# Altium integrated library PAT Connectors Board.IntLib: 28 symbols
Pins are listed as number, name and electrical type; pins without a type are passive.

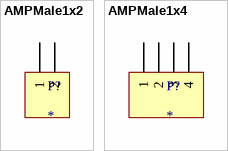
[diagram p0: symbols AMPMale1x2 to AMPMale1x4]

## AMPMale1x2
designator P?
Connector Polarized AMP 2.54mm; Digi-key Part Number: A19423-ND
footprint AMPMALE1x2
pins: 1, 2

## AMPMale1x4
designator P?
Connector Polarized AMP 2.54mm; Digi-key Part Number: A19431-ND
footprint AMPMale1x4
pins: 1, 2, 3, 4


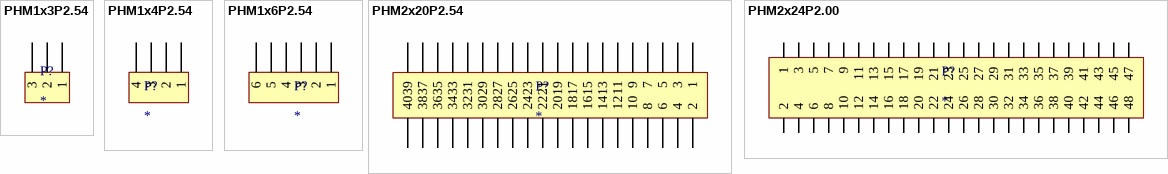
[diagram p1: symbols PHM1x3P2.54 to PHM2x24P2.00]

## PHM1x3P2.54
designator P?
Pin Header Male 3 Pins Pitch 2.54mm; Digi-Key Part Number: WM8085-ND
footprint MALE3PIN (Pin Header Male 3 Pins)
pins: 1, 2, 3

## PHM1x4P2.54
designator P?
Pin Header Male 1x4 Pitch 2.54mm; Digi-Key Part Number: 3M9449-ND
footprint MALE4PIN (Pin Header Male 1x4 Pitch 2.54mm)
pins: 1, 2, 3, 4

## PHM1x6P2.54
designator P?
Pin Header Male 6 Pins Pitch 2.54mm; Digi-Key Part Number: *
footprint MALE6PIN
pins: 1, 2, 3, 4, 5, 6

## PHM2x20P2.54
designator P?
Pin Header Male 40 Pins Pitch 2.54mm; Digi-Key Part Number: *
footprint MALE2x20PIN (Pin Header Male 40 Pins 2Rows)
pins: 1, 2, 3, 4, 5, 6, 7, 8, 9, 10, 11, 12, 13, 14, 15, 16, 17, 18, 19, 20, 21, 22, 23, 24, 25, 26, 27, 28, 29, 30, 31, 32, 33, 34, 35, 36, 37, 38, 39, 40

## PHM2x24P2.00
designator P?
Pin Header Male 2x24 pins with pitch 2mm; Digi-Key Part Number: 609-2908-ND
footprint MALEPIN2x24P2.0
footprint MALEPIN2x24P2.0RightAngle
pins: 1, 2, 3, 4, 5, 6, 7, 8, 9, 10, 11, 12, 13, 14, 15, 16, 17, 18, 19, 20, 21, 22, 23, 24, 25, 26, 27, 28, 29, 30, 31, 32, 33, 34, 35, 36, 37, 38, 39, 40, 41, 42, 43, 44, 45, 46, 47, 48


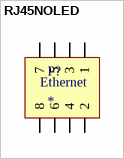
[diagram p2: symbol RJ45NOLED]

## RJ45NOLED
designator P?
Connector RJ45 Ethernet; Digi-Key Part Number: AE10387-ND
footprint RJ45NOLED (Connector RJ45 without led status)
pins: 1, 2, 3, 4, 5, 6, 7, 8
text: Ethernet


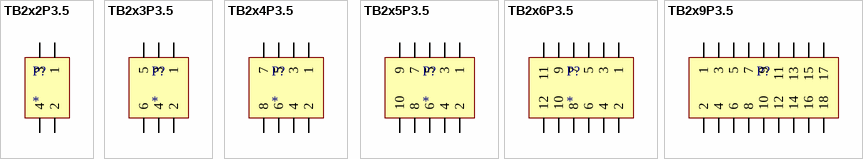
[diagram p3: symbols TB2x2P3.5 to TB2x9P3.5]

## TB2x2P3.5
designator P?
Connector Pitch 3.5mm with 2 rows and 2 columns; Digi-Key Part Number: 277-8738-ND
footprint TB2x2P3.5 (Terminal Block 2x3 with pitch 3.5mm)
pins: 1, 2, 3, 4

## TB2x3P3.5
designator P?
Connector Pitch 3.5mm with 2 rows and 3 columns; Digi-Key Part Number: 277-9777-ND
footprint TB2x3P3.5 (Terminal Block 2x3 with pitch 3.5mm)
pins: 1, 2, 3, 4, 5, 6

## TB2x4P3.5
designator P?
Connector Pitch 3.5mm with 2 rows and 4 columns; Digi-Key Part Number: 277-8739-ND
footprint TB2x4P3.5 (Terminal Block 2x4 with pitch 3.5mm)
pins: 1, 2, 3, 4, 5, 6, 7, 8

## TB2x5P3.5
designator P?
Connector Pitch 3.5mm with 2 rows and 5 columns; Digi-Key Part Number: 277-8740-ND
footprint TB2x5P3.5 (Terminal Block 2x5 with pitch 3.5mm)
pins: 1, 2, 3, 4, 5, 6, 7, 8, 9, 10

## TB2x6P3.5
designator P?
Connector Pitch 3.5mm with 2 rows and 6 columns; Digi-Key Part Number: 277-8741-ND
footprint TB2x6P3.5 (Terminal Block 2x6 with pitch 3.5mm)
pins: 1, 2, 3, 4, 5, 6, 7, 8, 9, 10, 11, 12

## TB2x9P3.5
designator P?  (value not drawn)
Connector Pitch 3.5mm with 2 rows and 9 columns
footprint TB2x9P3.5 (Terminal Block 2x11 with pitch 3.5mm)
pins: 1, 2, 3, 4, 5, 6, 7, 8, 9, 10, 11, 12, 13, 14, 15, 16, 17, 18


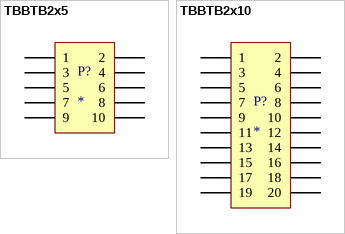
[diagram p4: symbols TBBTB2x5 to TBBTB2x10]

## TBBTB2x5
designator P?
Connector board to board 2 Rows, 5 Columns Pitch 2.54mm; Digi-Key Part Number: ED1543-ND
footprint TBBTB2x5 (Board to Board 2x5 Pitch 2.54mm)
footprint TBBTB2x5RightAngle
pins: 1, 2, 3, 4, 5, 6, 7, 8, 9, 10

## TBBTB2x10
designator P?
Connector board to board pitch 2.54mm; Digi-Key Part Number: ED10524-ND
footprint TBBTB2x10 (Board to Board 2x10 Pitch 2.54mm)
pins: 1, 2, 3, 4, 5, 6, 7, 8, 9, 10, 11, 12, 13, 14, 15, 16, 17, 18, 19, 20


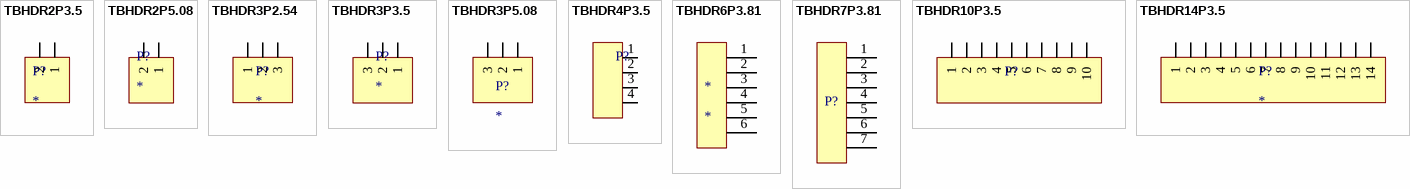
[diagram p5: symbols TBHDR2P3.5 to TBHDR14P3.5]

## TBHDR2P3.5
designator P?
Connector 2 positions with pitch 3.5mm; Digi-Key Part Number: 277-6718-ND
footprint TBHDR2P3.5 (Connector Green 2 positions with pitch 3.5mm)
footprint TBHDR2P3.5VERTICAL
footprint TBR2.5
pins: 1, 2

## TBHDR2P5.08
designator P?
Connector 2 positions with pitch 5.08mm; Digi-Key Part Number: ED1817-ND
footprint TBHDR2P5.08 (Connector Green 2 positions with pitch 5.08mm)
pins: 1, 2

## TBHDR3P2.54
designator P?
Connector 2 positions with pitch 2.54 mm; Digi-Key Part Number: 1195-3646-1-ND
footprint TBHDR3P2.54 (Terminal block 2 positions with pitch 2.54mm)
pins: 1, 2, 3

## TBHDR3P3.5
designator P?
Connector 3 positions with pitch 3.5mm; Digi-Key Part Number: 277-11008-ND
footprint TBHDR3P3.5 (Connector Green 3 positions with pitch 3.5mm)
footprint TBHDR3P3.5Vertical
pins: 1, 2, 3

## TBHDR3P5.08
designator P?
Connector 3 positions with pitch 5.08mm; Digi-Key Part Number: 277-1107-ND
footprint TBHDR3P5.08 (Connector Green 3 positions with pitch 5.08mm)
pins: 1, 2, 3

## TBHDR4P3.5
designator P?, comment TermBlock  (value not drawn)
Connector 4 positions; Digi-Key Part Number: 732-2765-ND
footprint TBHDR4P3.5 (Connector Green 4 positions with pitch 3.5mm)
pins: 1, 2, 3, 4

## TBHDR6P3.81
designator *
footprint TBHDR6P3.81
pins: 1, 2, 3, 4, 5, 6

## TBHDR7P3.81
designator P?
TERM BLOCK HDR 7POS 90DEG 3.81MM; Manufacturer Part Number: 1803329; Manufacturer: Phoenix Contact; Digi-Key Part Number: 277-1211-ND
footprint TBHDR7P3.81
pins: 1, 2, 3, 4, 5, 6, 7

## TBHDR10P3.5
designator P?  (value not drawn)
Connector 10 positions with pitch 3.5 mm; Digi-Key Part Number: 277-5813-ND
footprint TBHDR10P3.5
pins: 1, 2, 3, 4, 5, 6, 7, 8, 9, 10

## TBHDR14P3.5
designator P?
Connector 14 positions with pitch 3.5mm; Digi-Key Part Number: WM7782-ND
footprint TBHDR14P3.5
pins: 1, 2, 3, 4, 5, 6, 7, 8, 9, 10, 11, 12, 13, 14


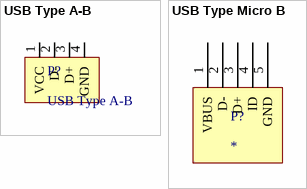
[diagram p6: symbols USB Type A-B to USB Type Micro B]

## USB Type A-B
designator P?
Connector Type A or B; Digi-Key Part Number: 1175-1017-ND
footprint USB Type A (USB Connector A)
footprint USB Type B (USB Connector B)
footprint USB Type A Vertical
pins: 1 VCC, 2 D-, 3 D+, 4 GND

## USB Type Micro B
designator P?
Connector Type Micro B; Digi-Key Part Number: 609-4052-1-ND
footprint USB Type Micro B (USB Connector Micro B)
pins: 1 VBUS, 2 D-, 3 D+, 4 ID, 5 GND